# Altium footprint library Footprints.PcbLib: 67 footprints (part 1 of 5)
Each footprint in its own frame and in the unit in brackets; x right, y up, seen from the top. Pads: shape width x height; smd on the part's side, far side on the other; paste and mask are expansions set on the pad; w line width, h text height; cw(c..) or ccw(c..) is an arc to the next point about the centre after c.
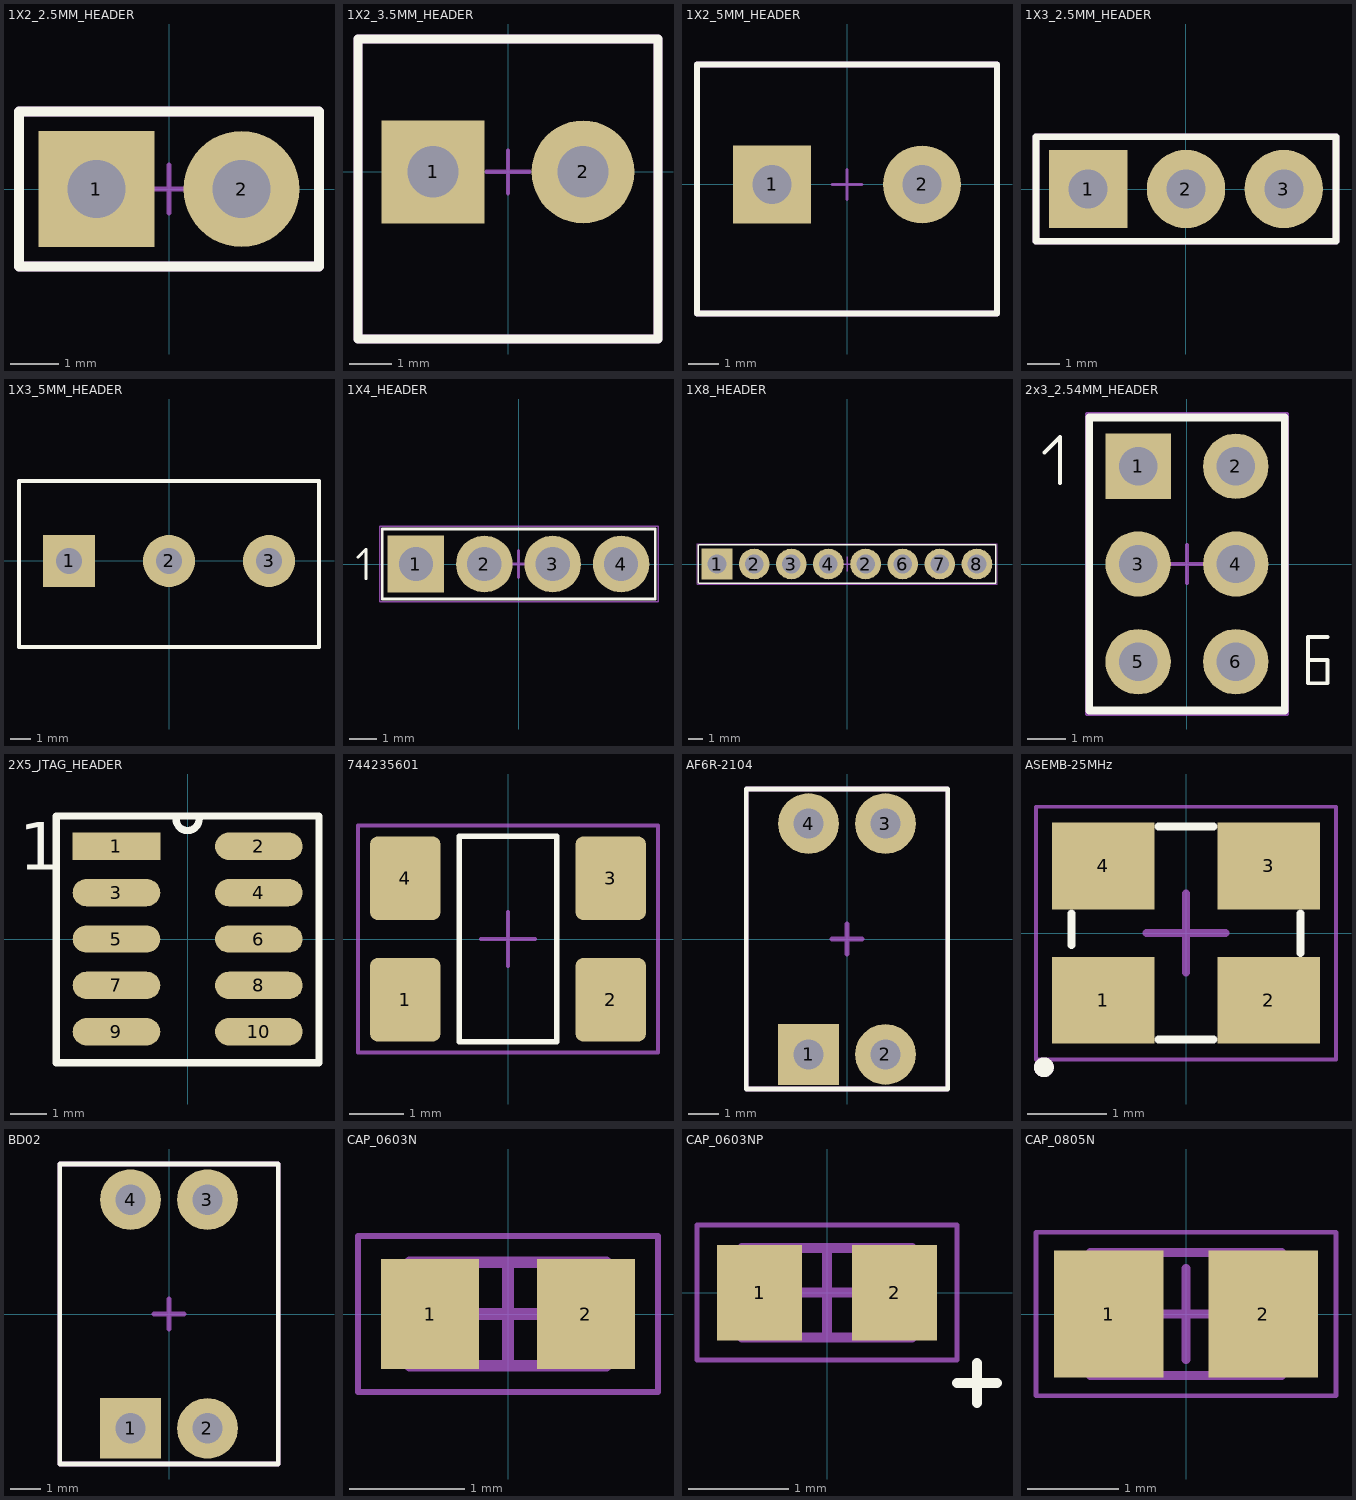
[diagram p0: the footprints below, top view; thin cyan lines are the x and y axes]

## 1X2_2.5MM_HEADER [mm]
pads (2):
  rect 2.4x2.4 hole 1.2: 1(-1.5,0)
  round 2.4 hole 1.2: 2(1.5,0)
Top Overlay:
  lines w0.2: -3.1,-1.6 3.1,-1.6 3.1,1.6 -3.1,1.6 -3.1,-1.6
Mechanical 15:
  lines w0.1: -0.5,0 0.5,0 ; 0,-0.5 0,0.5
  lines w0.2: -3.1,-1.6 -3.1,1.6 3.1,1.6 3.1,-1.6 -3.1,-1.6

## 1X2_3.5MM_HEADER [mm]
pads (2):
  rect 2.4x2.4 hole 1.2: 1(-1.75,0)
  round 2.4 hole 1.2: 2(1.75,0)
Top Overlay:
  lines w0.2: -3.5,-3.9 -3.5,3.1 3.5,3.1 3.5,-3.9 -3.5,-3.9
Mechanical 15:
  lines w0.1: -0.5,0 0.5,0 ; 0,-0.5 0,0.5
  lines w0.2: -3.5,-3.9 3.5,-3.9 3.5,3.1 -3.5,3.1 -3.5,-3.9
3D body "pxc_1984617_02_PT-1-5-2-3-5-H_3D.stp": height 9.16, standoff -4.49, extent -3.55,-4.525 4.15,3.025

## 1X2_5MM_HEADER [mm]
pads (2):
  rect 2.6x2.6 hole 1.3: 1(-2.5,0)
  round 2.6 hole 1.3: 2(2.5,0)
Top Overlay:
  lines w0.2: -5,-4.3 5,-4.3 5,4 -5,4 -5,-4.3
Mechanical 15:
  lines w0.1: -0.5,0 0.5,0 ; 0,-0.5 0,0.5
  lines w0.2: -5,-4.3 5,-4.3 5,4 -5,4 -5,-4.3
3D body "pxc_1935161_04_PT-1-5-2-5-0-H_3D.stp": height 11.41, standoff -3.49, extent -4.985,-5 5.585,4

## 1X3_2.5MM_HEADER [mm]
pads (3):
  rect 2.4x2.4 hole 1.2: 1(-3,0)
  round 2.4 hole 1.2: 2(0,0) 3(3,0)
Top Overlay:
  lines w0.2: -4.6,-1.6 -4.6,1.6 4.6,1.6 4.6,-1.6 -4.6,-1.6
Mechanical 15:
  lines w0.1: -0.5,0 0.5,0 ; 0,-0.5 0,0.5
  lines w0.2: -4.6,-1.6 4.6,-1.6 4.6,1.6 -4.6,1.6 -4.6,-1.6

## 1X3_5MM_HEADER [mm]
pads (3):
  rect 2.6x2.6 hole 1.3: 1(-5,0)
  round 2.6 hole 1.3: 2(0,0) 3(5,0)
Top Overlay:
  lines w0.2: -7.5,-4.3 -7.5,4 7.5,4 7.5,-4.3 -7.5,-4.3
Mechanical 15:
  lines w0.1: -0.5,0 0.5,0 ; 0,-0.5 0,0.5
  lines w0.2: -7.5,-4.3 -7.5,4 7.5,4 7.5,-4.3 -7.5,-4.3
3D body "pxc_1935174_03_PT-1-5-3-5-0-H_3D.stp": height 11.41, standoff -3.49, extent -7.46,-4.95 8.11,4.05

## 1X4_HEADER [mm]
pads (4):
  rect 2.1x2.1 hole 1.27: 1(-3.81,0)
  round 2.1 hole 1.27: 2(-1.27,0) 3(1.27,0) 4(3.81,0)
Top Overlay:
  lines w0.1: -5.66,-0.55 -5.66,0.55 -5.96,0.25 ; -5.96,0.25 -5.96,0.25 ; -5.06,-1.3 5.08,-1.3 5.08,1.3 -5.06,1.3 -5.06,-1.3
Mechanical 15:
  lines w0.05: -5.16,-1.4 -5.16,1.4 5.18,1.4 5.18,-1.4 -5.16,-1.4
  lines w0.1: -0.5,0 0.5,0 ; 0,-0.5 0,0.5
3D body "User Library-1x4 TH Pitch 2_54mm.STEP": height 9.21, standoff -3.49, extent -5.08,-1.27 5.08,1.27

## 1X8_HEADER [mm]
pads (8):
  rect 2.1x2.1 hole 1.27: 1(-8.89,0)
  round 2.1 hole 1.27: 2(-6.35,0) 2(1.27,0) 3(-3.81,0) 4(-1.27,0) 6(3.81,0) 7(6.35,0) 8(8.89,0)
Top Overlay:
  lines w0.1: -10.16,-1.3 -10.16,1.3 ; -10.14,-1.3 10.16,-1.3 10.16,1.3 -10.14,1.3 ; -5.66,-0.55 -5.66,0.55 -5.96,0.25 ; -5.96,0.25 -5.96,0.25
Mechanical 15:
  lines w0.05: -10.26,-1.4 -10.26,1.4 ; -10.24,-1.4 10.26,-1.4 10.26,1.4 -10.24,1.4
  lines w0.1: -0.5,0 0.5,0 ; 0,-0.5 0,0.5

## 2x3_2.54MM_HEADER [mm]
pads (6):
  rect 1.7x1.7 hole 1: 1(-1.27,2.54)
  round 1.7 hole 1: 2(1.27,2.54) 3(-1.27,0) 4(1.27,0) 5(-1.27,-2.54) 6(1.27,-2.54)
Top Overlay:
  lines w0.1: -3.3,2.1 -3.3,3.3 -3.7,2.9 ; 3.15,-2.5 3.65,-2.5 3.65,-3.1 3.15,-3.1 3.15,-1.9 3.65,-1.9 ; -3.7,2.9 -3.7,2.9
  lines w0.2: -2.54,-3.81 2.54,-3.81 2.54,3.81 -2.54,3.81 -2.54,-3.81
Mechanical 15:
  lines w0.1: -0.5,0 0.5,0 ; 0,-0.5 0,0.5 ; -2.6,-3.9 -2.6,3.9 2.6,3.9 2.6,-3.9 -2.6,-3.9
3D body "User Library-2x3 TH Pitch 2_54mm.STEP": height 9.21, standoff -3.49, extent -2.53,-3.81 2.55,3.81

## 2X5_JTAG_HEADER [mm] "2X5_JTAG_HEADER"
pads (10):
  rect 2.4x0.75 smd: 1(-1.95,2.55)
  oval 2.4x0.75 smd: 2(1.95,2.55) 3(-1.95,1.28) 4(1.95,1.28) 5(-1.95,0.01) 6(1.95,0.01) 7(-1.95,-1.26) 8(1.95,-1.26) 9(-1.95,-2.53) 10(1.95,-2.53)
Top Overlay:
  lines w0.2: -0.318,3.3 ccw(c0,3.3) 0.318,3.3 ; -3.6,-3.38 -3.6,3.38 3.6,3.38 3.6,-3.38 -3.6,-3.38
  text "1" at -4.621,1.904 h1.3
3D body: height 7.7, standoff -0.07, extent -3.6,-3.175 3.6,3.175

## 744235601 [mm]
pads (4):
  rrect22% 1.3x1.55 smd: 1(-1.9,-1.125) 2(1.9,-1.125) 3(1.9,1.125) 4(-1.9,1.125)
Top Overlay:
  lines w0.1: -0.9,-1.9 -0.9,1.9 0.9,1.9 0.9,-1.9 -0.9,-1.9
Mechanical 15:
  lines w0.08: -0.5,0 0.5,0 ; 0,-0.5 0,0.5 ; -2.775,-2.1 -2.775,2.1 2.775,2.1 2.775,-2.1 -2.775,-2.1
3D body "744235101_Download_STP_WE-CNSW-1812_rev1.stp": height 2.81, standoff -0.04, extent -2.25,-1.6 2.25,1.6

## AF6R-2104 [mm]
pads (4):
  rect 2x2 hole 1: 1(-1.27,-3.81)
  round 2 hole 1: 2(1.27,-3.81) 3(1.27,3.81) 4(-1.27,3.81)
Top Overlay:
  lines w0.15: -3.32,-4.95 3.32,-4.95 3.32,4.95 -3.32,4.95 -3.32,-4.95
Mechanical 15:
  lines w0.15: -0.5,0 0.5,0 ; 0,-0.5 0,0.5 ; -3.32,-4.95 3.32,-4.95 3.32,4.95 -3.32,4.95 -3.32,-4.95
3D body "a6fr-2101.stp": height 10.21, standoff -3.19, extent -3.3,-4.95 3.34,4.95

## ASEMB-25MHz [mm]
pads (4):
  rect 1.3x1.1 smd: 1(-1.05,-0.85) 2(1.05,-0.85) 3(1.05,0.85) 4(-1.05,0.85)
Top Overlay:
  circle w0.15: c-1.8,-1.7 r0.05
  lines w0.1: -1.45,-0.15 -1.45,0.25 ; -0.35,-1.35 0.35,-1.35 ; -0.35,1.35 0.35,1.35 ; 1.45,-0.25 1.45,0.25
Polarity (Mech13):
  circle w0.15: c-1.8,-1.7 r0.05
Mechanical 15:
  lines w0.05: -1.9,-1.6 -1.9,1.6 1.9,1.6 1.9,-1.6 -1.9,-1.6
  lines w0.1: -0.5,0 0.5,0 ; 0,-0.5 0,0.5
3D body "ASEMB.STEP": height 0.86, standoff 0.01, extent -1.6,-1.25 1.6,1.25

## BD02 [mm]
pads (4):
  rect 2x2 hole 1: 1(-1.27,-3.775)
  round 2 hole 1: 2(1.27,-3.775) 3(1.27,3.775) 4(-1.27,3.775)
Top Overlay:
  lines w0.15: -3.6,-4.95 -3.6,4.95 3.6,4.95 3.6,-4.95 -3.6,-4.95
Mechanical 15:
  lines w0.15: -0.5,0 0.5,0 ; 0,-0.5 0,0.5 ; -3.6,-4.95 -3.6,4.95 3.6,4.95 3.6,-4.95 -3.6,-4.95
3D body "BD02.stp": height 7.56, standoff -3.57, extent -3.555,-4.825 3.555,4.825

## CAP_0603N [mm] "CAPC1608X90X35NL10T15, Chip Capacitor, 2-Leads, Body 1.7x0.9mm, IPC Medium Density"
height 0.9
pads (2):
  rect 0.85x0.95 smd: 1(-0.675,0) 2(0.675,0)
Mechanical 1:
  lines w0.1: -0.85,-0.45 -0.85,0.45 0.85,0.45 0.85,-0.45 -0.85,-0.45
Mechanical 15:
  lines w0.05: -1.3,-0.675 -1.3,0.675 1.3,0.675 1.3,-0.675 -1.3,-0.675
  lines w0.1: -0.45,0 0.45,0 ; 0,-0.45 0,0.45
3D body "CAPC1608X09N.step": height 0.9, standoff 0, extent -0.85,-0.45 0.85,0.45

## CAP_0603NP [mm] "CAPC1608X90X35NL10T15, Chip Capacitor, 2-Leads, Body 1.7x0.9mm, IPC Medium Density"
height 0.9
pads (2):
  rect 0.85x0.95 smd: 1(-0.675,0) 2(0.675,0)
Top Overlay:
  lines w0.1: 1.3,-0.9 1.7,-0.9 ; 1.5,-1.1 1.5,-0.7
Mechanical 1:
  lines w0.1: -0.85,-0.45 -0.85,0.45 0.85,0.45 0.85,-0.45 -0.85,-0.45
Mechanical 15:
  lines w0.05: -1.3,-0.675 -1.3,0.675 1.3,0.675 1.3,-0.675 -1.3,-0.675
  lines w0.1: -0.45,0 0.45,0 ; 0,-0.45 0,0.45
3D body "CAPC1608X09N.step": height 0.9, standoff 0, extent -0.85,-0.45 0.85,0.45

## CAP_0805N [mm] "Chip Capacitor, 2-Leads, Body 2.00x1.25mm, IPC Medium Density"
height 1.35
pads (2):
  rect 1.2x1.4 smd: 1(-0.85,0) 2(0.85,0)
Mechanical 1:
  lines w0.1: -1.05,-0.675 1.05,-0.675 1.05,0.675 -1.05,0.675 -1.05,-0.675
Mechanical 15:
  lines w0.05: -1.65,-0.9 1.65,-0.9 1.65,0.9 -1.65,0.9 -1.65,-0.9
  lines w0.1: -0.5,0 0.5,0 ; 0,-0.5 0,0.5
3D body "C0805C104K5RACTU.stp": height 0.88, standoff 0, extent -1,-0.625 1,0.625